# Altium footprint library CONN_HDR_1.27MM_ST.PcbLib: 116 footprints (part 3 of 9)
Each footprint in its own frame and in the unit in brackets; x right, y up, seen from the top. Pads: shape width x height; smd on the part's side, far side on the other; paste and mask are expansions set on the pad; w line width, h text height; cw(c..) or ccw(c..) is an arc to the next point about the centre after c.
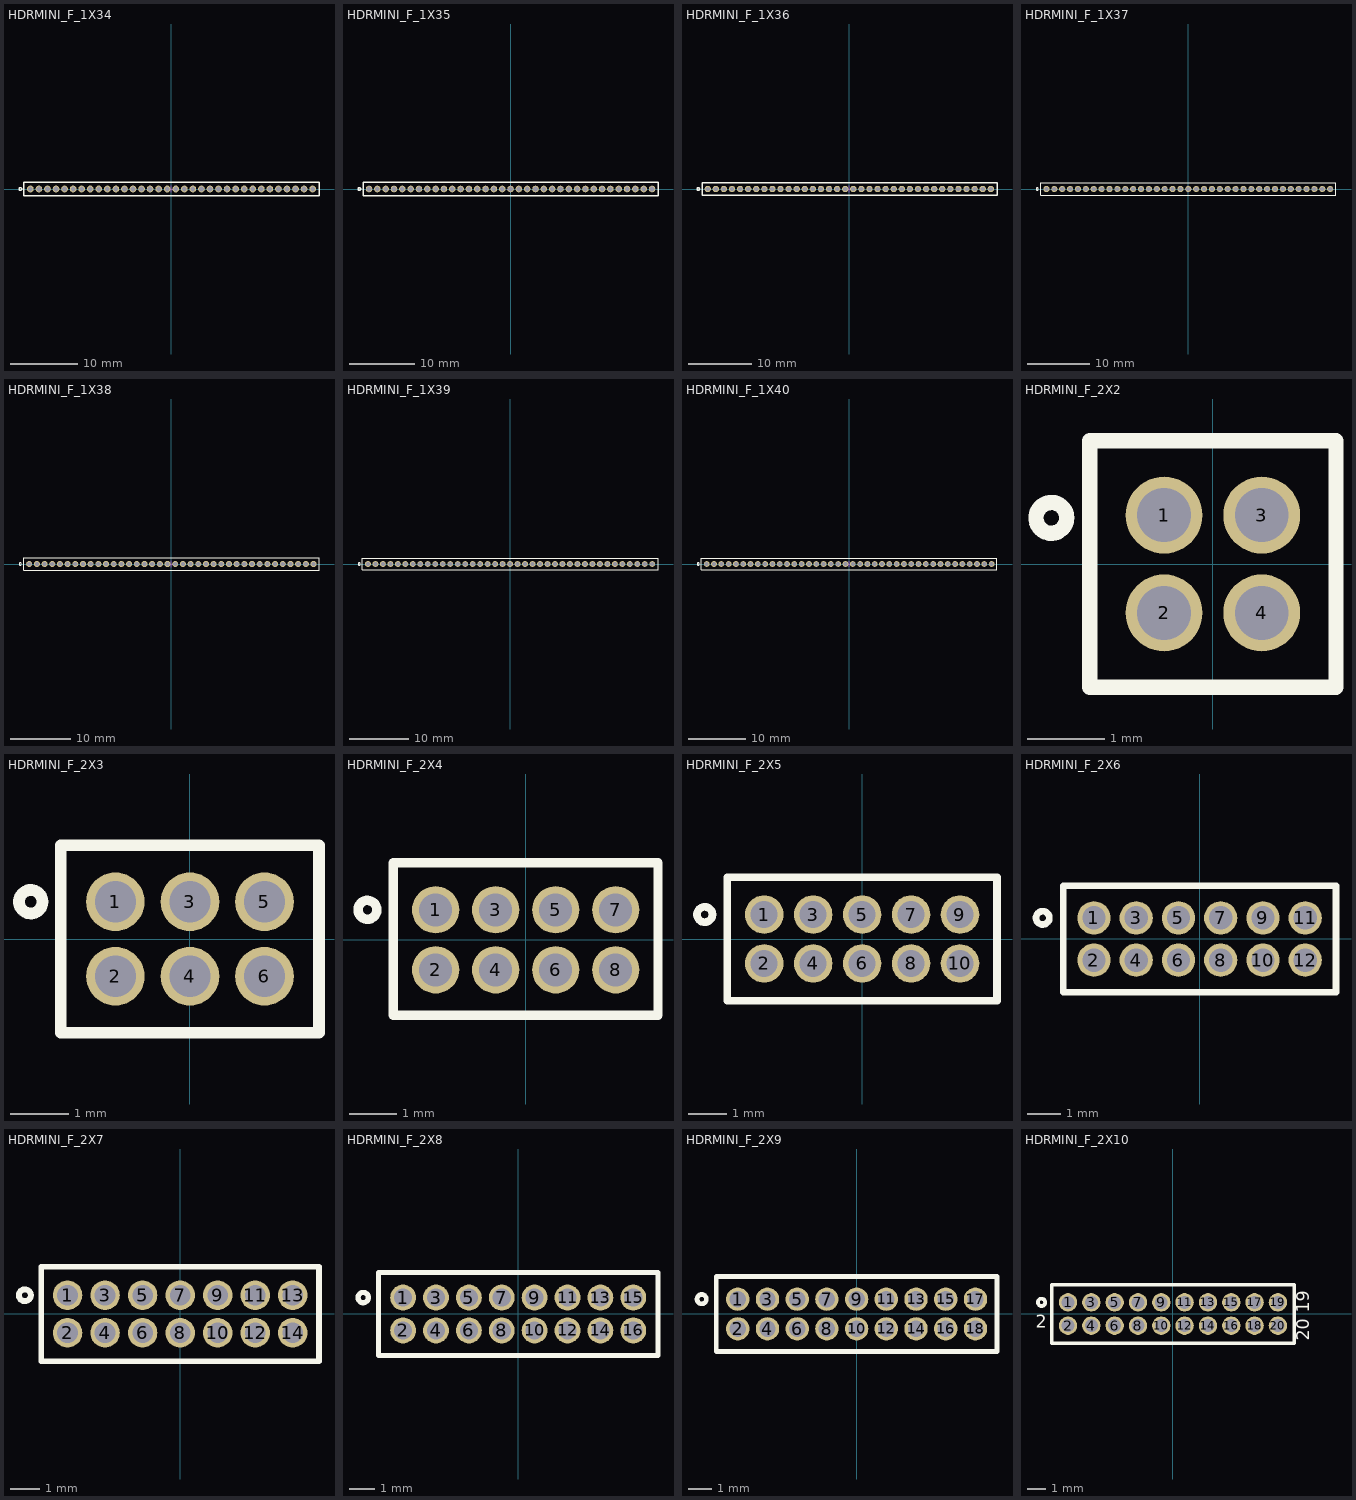
[diagram p2: the footprints below, top view; thin cyan lines are the x and y axes]

## HDRMINI_F_1X34 [mm] "mini header (50mil pitch)"
pads (34):
  round 1 / inner round 1 / far side oval 1x1.4 hole 0.7 mask+0.05: 1(-20.955,0) 2(-19.685,0) 3(-18.415,0) 4(-17.145,0) 5(-15.875,0) 6(-14.605,0) 7(-13.335,0) 8(-12.065,0) 9(-10.795,0) 10(-9.525,0) 11(-8.255,0) 12(-6.985,0) 13(-5.715,0) 14(-4.445,0) 15(-3.175,0) 16(-1.905,0) 17(-0.635,0) 18(0.635,0) 19(1.905,0) 20(3.175,0) 21(4.445,0) 22(5.715,0) 23(6.985,0) 24(8.255,0) 25(9.525,0) 26(10.795,0) 27(12.065,0) 28(13.335,0) 29(14.605,0) 30(15.875,0) 31(17.145,0) 32(18.415,0) 33(19.685,0) 34(20.955,0)
Top Overlay:
  circle w0.2: c-22.44,0 r0.2
  lines w0.2: -21.9,-1 21.9,-1 21.9,1 -21.9,1 -21.9,-1
Mechanical 1:
  lines w0.1: -0.5,0 0.5,0 ; 0,-0.5 0,0.5
3D body "female_header_a-bl127-eg-g34d.stp": height 3.45, standoff -2.35, extent -21.79,-0.9 21.79,0.9

## HDRMINI_F_1X35 [mm] "mini header (50mil pitch)"
pads (35):
  round 1 / inner round 1 / far side oval 1x1.4 hole 0.7 mask+0.05: 1(-21.59,0) 2(-20.32,0) 3(-19.05,0) 4(-17.78,0) 5(-16.51,0) 6(-15.24,0) 7(-13.97,0) 8(-12.7,0) 9(-11.43,0) 10(-10.16,0) 11(-8.89,0) 12(-7.62,0) 13(-6.35,0) 14(-5.08,0) 15(-3.81,0) 16(-2.54,0) 17(-1.27,0) 18(0,0) 19(1.27,0) 20(2.54,0) 21(3.81,0) 22(5.08,0) 23(6.35,0) 24(7.62,0) 25(8.89,0) 26(10.16,0) 27(11.43,0) 28(12.7,0) 29(13.97,0) 30(15.24,0) 31(16.51,0) 32(17.78,0) 33(19.05,0) 34(20.32,0) 35(21.59,0)
Top Overlay:
  circle w0.2: c-23.075,0 r0.2
  lines w0.2: -22.5,-1 22.5,-1 22.5,1 -22.5,1 -22.5,-1
Mechanical 1:
  lines w0.1: -0.5,0 0.5,0 ; 0,-0.5 0,0.5
3D body "female_header_a-bl127-eg-g35d.stp": height 3.45, standoff -2.35, extent -22.425,-0.9 22.425,0.9

## HDRMINI_F_1X36 [mm] "mini header (50mil pitch)"
pads (36):
  round 1 / inner round 1 / far side oval 1x1.4 hole 0.7 mask+0.05: 1(-22.225,0) 2(-20.955,0) 3(-19.685,0) 4(-18.415,0) 5(-17.145,0) 6(-15.875,0) 7(-14.605,0) 8(-13.335,0) 9(-12.065,0) 10(-10.795,0) 11(-9.525,0) 12(-8.255,0) 13(-6.985,0) 14(-5.715,0) 15(-4.445,0) 16(-3.175,0) 17(-1.905,0) 18(-0.635,0) 19(0.635,0) 20(1.905,0) 21(3.175,0) 22(4.445,0) 23(5.715,0) 24(6.985,0) 25(8.255,0) 26(9.525,0) 27(10.795,0) 28(12.065,0) 29(13.335,0) 30(14.605,0) 31(15.875,0) 32(17.145,0) 33(18.415,0) 34(19.685,0) 35(20.955,0) 36(22.225,0)
Top Overlay:
  circle w0.2: c-23.71,0 r0.2
  lines w0.2: -23.1,-1 23.2,-1 23.2,1 -23.1,1 -23.1,-1
Mechanical 1:
  lines w0.1: -0.5,0 0.5,0 ; 0,-0.5 0,0.5
3D body "female_header_a-bl127-eg-g36d.stp": height 3.45, standoff -2.35, extent -23.06,-0.9 23.06,0.9

## HDRMINI_F_1X37 [mm] "mini header (50mil pitch)"
pads (37):
  round 1 / inner round 1 / far side oval 1x1.4 hole 0.7 mask+0.05: 1(-22.86,0) 2(-21.59,0) 3(-20.32,0) 4(-19.05,0) 5(-17.78,0) 6(-16.51,0) 7(-15.24,0) 8(-13.97,0) 9(-12.7,0) 10(-11.43,0) 11(-10.16,0) 12(-8.89,0) 13(-7.62,0) 14(-6.35,0) 15(-5.08,0) 16(-3.81,0) 17(-2.54,0) 18(-1.27,0) 19(0,0) 20(1.27,0) 21(2.54,0) 22(3.81,0) 23(5.08,0) 24(6.35,0) 25(7.62,0) 26(8.89,0) 27(10.16,0) 28(11.43,0) 29(12.7,0) 30(13.97,0) 31(15.24,0) 32(16.51,0) 33(17.78,0) 34(19.05,0) 35(20.32,0) 36(21.59,0) 37(22.86,0)
Top Overlay:
  circle w0.2: c-24.345,0 r0.2
  lines w0.2: -23.8,-1 23.8,-1 23.8,1 -23.8,1 -23.8,-1
Mechanical 1:
  lines w0.1: -0.5,0 0.5,0 ; 0,-0.5 0,0.5
3D body "female_header_a-bl127-eg-g37d.stp": height 3.45, standoff -2.35, extent -23.695,-0.9 23.695,0.9

## HDRMINI_F_1X38 [mm] "mini header (50mil pitch)"
pads (38):
  round 1 / inner round 1 / far side oval 1x1.4 hole 0.7 mask+0.05: 1(-23.495,0) 2(-22.225,0) 3(-20.955,0) 4(-19.685,0) 5(-18.415,0) 6(-17.145,0) 7(-15.875,0) 8(-14.605,0) 9(-13.335,0) 10(-12.065,0) 11(-10.795,0) 12(-9.525,0) 13(-8.255,0) 14(-6.985,0) 15(-5.715,0) 16(-4.445,0) 17(-3.175,0) 18(-1.905,0) 19(-0.635,0) 20(0.635,0) 21(1.905,0) 22(3.175,0) 23(4.445,0) 24(5.715,0) 25(6.985,0) 26(8.255,0) 27(9.525,0) 28(10.795,0) 29(12.065,0) 30(13.335,0) 31(14.605,0) 32(15.875,0) 33(17.145,0) 34(18.415,0) 35(19.685,0) 36(20.955,0) 37(22.225,0) 38(23.495,0)
Top Overlay:
  circle w0.2: c-24.98,0 r0.2
  lines w0.2: -24.4,-1 -24.4,1 24.4,1 24.4,-1 -24.4,-1
Mechanical 1:
  lines w0.1: -0.5,0 0.5,0 ; 0,-0.5 0,0.5
3D body "female_header_a-bl127-eg-g38d.stp": height 3.45, standoff -2.35, extent -24.33,-0.9 24.33,0.9

## HDRMINI_F_1X39 [mm] "mini header (50mil pitch)"
pads (39):
  round 1 / inner round 1 / far side oval 1x1.4 hole 0.7 mask+0.05: 1(-24.13,0) 2(-22.86,0) 3(-21.59,0) 4(-20.32,0) 5(-19.05,0) 6(-17.78,0) 7(-16.51,0) 8(-15.24,0) 9(-13.97,0) 10(-12.7,0) 11(-11.43,0) 12(-10.16,0) 13(-8.89,0) 14(-7.62,0) 15(-6.35,0) 16(-5.08,0) 17(-3.81,0) 18(-2.54,0) 19(-1.27,0) 20(0,0) 21(1.27,0) 22(2.54,0) 23(3.81,0) 24(5.08,0) 25(6.35,0) 26(7.62,0) 27(8.89,0) 28(10.16,0) 29(11.43,0) 30(12.7,0) 31(13.97,0) 32(15.24,0) 33(16.51,0) 34(17.78,0) 35(19.05,0) 36(20.32,0) 37(21.59,0) 38(22.86,0) 39(24.13,0)
Top Overlay:
  circle w0.2: c-25.615,0 r0.2
  lines w0.2: -25.1,-1 -25.1,1 25.1,1 25.1,-1 -25.1,-1
Mechanical 1:
  lines w0.1: -0.5,0 0.5,0 ; 0,-0.5 0,0.5
3D body "female_header_a-bl127-eg-g39d.stp": height 3.45, standoff -2.35, extent -24.965,-0.9 24.965,0.9

## HDRMINI_F_1X40 [mm] "mini header (50mil pitch)"
pads (40):
  round 1 / inner round 1 / far side oval 1x1.4 hole 0.7 mask+0.05: 1(-24.765,0) 2(-23.495,0) 3(-22.225,0) 4(-20.955,0) 5(-19.685,0) 6(-18.415,0) 7(-17.145,0) 8(-15.875,0) 9(-14.605,0) 10(-13.335,0) 11(-12.065,0) 12(-10.795,0) 13(-9.525,0) 14(-8.255,0) 15(-6.985,0) 16(-5.715,0) 17(-4.445,0) 18(-3.175,0) 19(-1.905,0) 20(-0.635,0) 21(0.635,0) 22(1.905,0) 23(3.175,0) 24(4.445,0) 25(5.715,0) 26(6.985,0) 27(8.255,0) 28(9.525,0) 29(10.795,0) 30(12.065,0) 31(13.335,0) 32(14.605,0) 33(15.875,0) 34(17.145,0) 35(18.415,0) 36(19.685,0) 37(20.955,0) 38(22.225,0) 39(23.495,0) 40(24.765,0)
Top Overlay:
  circle w0.2: c-26.25,0 r0.2
  lines w0.2: -25.7,-1 25.7,-1 25.7,1 -25.7,1 -25.7,-1
Mechanical 1:
  lines w0.1: -0.5,0 0.5,0 ; 0,-0.5 0,0.5
3D body "female_header_a-bl127-eg-g40d.stp": height 3.45, standoff -2.35, extent -25.6,-0.9 25.6,0.9

## HDRMINI_F_2X2 [mm] "mini header (50mil pitch)"
pads (4):
  round 1 hole 0.7 mask+0.05: 1(-0.635,0.635) 2(-0.635,-0.635) 3(0.635,0.635) 4(0.635,-0.635)
Top Overlay:
  circle w0.2: c-2.1,0.6 r0.2
  lines w0.2: -1.6,-1.6 -1.6,1.6 1.6,1.6 1.6,-1.6 -1.6,-1.6
3D body "female_header_a-bl127-eg-g02d.step": height 3.45, standoff -2.35, extent -1.47,-0.265 1.275,1.535
3D body "female_header_a-bl127-eg-g02d.step": height 3.45, standoff -2.35, extent -1.47,-1.535 1.275,0.265

## HDRMINI_F_2X3 [mm] "mini header (50mil pitch)"
pads (6):
  round 1 hole 0.7 mask+0.05: 1(-1.27,0.635) 2(-1.27,-0.635) 3(0,0.635) 4(0,-0.635) 5(1.27,0.635) 6(1.27,-0.635)
Top Overlay:
  circle w0.2: c-2.713,0.635 r0.2
  lines w0.2: -2.2,-1.6 -2.2,1.6 2.2,1.6 2.2,-1.6 -2.2,-1.6
3D body "female_header_a-bl127-eg-g03d.stp": height 3.45, standoff -2.35, extent -2.105,-1.535 2.105,0.265
3D body "female_header_a-bl127-eg-g03d.stp": height 3.45, standoff -2.35, extent -2.105,-0.265 2.105,1.535

## HDRMINI_F_2X4 [mm] "mini header (50mil pitch)"
pads (8):
  round 1 hole 0.7 mask+0.05: 1(-1.905,0.635) 2(-1.905,-0.635) 3(-0.635,0.635) 4(-0.635,-0.635) 5(0.635,0.635) 6(0.635,-0.635) 7(1.905,0.635) 8(1.905,-0.635)
Top Overlay:
  circle w0.2: c-3.348,0.635 r0.2
  lines w0.2: -2.8,-1.6 -2.8,1.635 2.8,1.635 2.8,-1.6 -2.8,-1.6
3D body "female_header_a-bl127-eg-g04d.stp": height 3.45, standoff -2.35, extent -2.74,-0.265 2.74,1.535
3D body "female_header_a-bl127-eg-g04d.stp": height 3.45, standoff -2.35, extent -2.74,-1.535 2.74,0.265

## HDRMINI_F_2X5 [mm] "mini header (50mil pitch)"
pads (10):
  round 1 hole 0.7 mask+0.05: 1(-2.54,0.635) 2(-2.54,-0.635) 3(-1.27,0.635) 4(-1.27,-0.635) 5(0,0.635) 6(0,-0.635) 7(1.27,0.635) 8(1.27,-0.635) 9(2.54,0.635) 10(2.54,-0.635)
Top Overlay:
  circle w0.2: c-4.083,0.635 r0.2
  lines w0.2: -3.5,-1.6 3.5,-1.6 3.5,1.6 -3.5,1.6 -3.5,-1.6
3D body "female_header_a-bl127-eg-g05d.stp": height 3.45, standoff -2.35, extent -3.375,-0.265 3.375,1.535
3D body "female_header_a-bl127-eg-g05d.stp": height 3.45, standoff -2.35, extent -3.375,-1.535 3.375,0.265

## HDRMINI_F_2X6 [mm] "mini header (50mil pitch)"
pads (12):
  round 1 hole 0.7 mask+0.05: 1(-3.175,0.635) 2(-3.175,-0.635) 3(-1.905,0.635) 4(-1.905,-0.635) 5(-0.635,0.635) 6(-0.635,-0.635) 7(0.635,0.635) 8(0.635,-0.635) 9(1.905,0.635) 10(1.905,-0.635) 11(3.175,0.635) 12(3.175,-0.635)
Top Overlay:
  circle w0.2: c-4.718,0.635 r0.2
  lines w0.2: -4.1,-1.6 -4.1,1.6 4.1,1.6 4.1,-1.6 -4.1,-1.6
3D body "female_header_a-bl127-eg-g06d.stp": height 3.45, standoff -2.35, extent -4.01,-0.265 4.01,1.535
3D body "female_header_a-bl127-eg-g06d.stp": height 3.45, standoff -2.35, extent -4.01,-1.535 4.01,0.265

## HDRMINI_F_2X7 [mm] "mini header (50mil pitch)"
pads (14):
  round 1 hole 0.7 mask+0.05: 1(-3.81,0.635) 2(-3.81,-0.635) 3(-2.54,0.635) 4(-2.54,-0.635) 5(-1.27,0.635) 6(-1.27,-0.635) 7(0,0.635) 8(0,-0.635) 9(1.27,0.635) 10(1.27,-0.635) 11(2.54,0.635) 12(2.54,-0.635) 13(3.81,0.635) 14(3.81,-0.635)
Top Overlay:
  circle w0.2: c-5.253,0.635 r0.2
  lines w0.2: -4.7,-1.6 -4.7,1.6 4.7,1.6 4.7,-1.6 -4.7,-1.6
3D body "female_header_a-bl127-eg-g07d.stp": height 3.45, standoff -2.35, extent -4.645,-0.265 4.645,1.535
3D body "female_header_a-bl127-eg-g07d.stp": height 3.45, standoff -2.35, extent -4.645,-1.535 4.645,0.265

## HDRMINI_F_2X8 [mm] "mini header (50mil pitch)"
pads (16):
  round 1 hole 0.7 mask+0.05: 1(-4.445,0.635) 2(-4.445,-0.635) 3(-3.175,0.635) 4(-3.175,-0.635) 5(-1.905,0.635) 6(-1.905,-0.635) 7(-0.635,0.635) 8(-0.635,-0.635) 9(0.635,0.635) 10(0.635,-0.635) 11(1.905,0.635) 12(1.905,-0.635) 13(3.175,0.635) 14(3.175,-0.635) 15(4.445,0.635) 16(4.445,-0.635)
Top Overlay:
  circle w0.2: c-5.988,0.635 r0.2
  lines w0.2: -5.4,-1.6 -5.4,1.6 5.4,1.6 5.4,-1.6 -5.4,-1.6
3D body "female_header_a-bl127-eg-g08d.stp": height 3.45, standoff -2.35, extent -5.28,-1.535 5.28,0.265
3D body "female_header_a-bl127-eg-g08d.stp": height 3.45, standoff -2.35, extent -5.28,-0.265 5.28,1.535

## HDRMINI_F_2X9 [mm] "mini header (50mil pitch)"
pads (18):
  round 1 hole 0.7 mask+0.05: 1(-5.08,0.635) 2(-5.08,-0.635) 3(-3.81,0.635) 4(-3.81,-0.635) 5(-2.54,0.635) 6(-2.54,-0.635) 7(-1.27,0.635) 8(-1.27,-0.635) 9(0,0.635) 10(0,-0.635) 11(1.27,0.635) 12(1.27,-0.635) 13(2.54,0.635) 14(2.54,-0.635) 15(3.81,0.635) 16(3.81,-0.635) 17(5.08,0.635) 18(5.08,-0.635)
Top Overlay:
  circle w0.2: c-6.623,0.635 r0.2
  lines w0.2: -6,-1.6 6,-1.6 6,1.6 -6,1.6 -6,-1.6
3D body "female_header_a-bl127-eg-g09d.stp": height 3.45, standoff -2.35, extent -5.915,-1.535 5.915,0.265
3D body "female_header_a-bl127-eg-g09d.stp": height 3.45, standoff -2.35, extent -5.915,-0.265 5.915,1.535

## HDRMINI_F_2X10 [mm] "mini header (50mil pitch)"
pads (20):
  round 1 hole 0.7 mask+0.05: 1(-5.715,0.635) 2(-5.715,-0.635) 3(-4.445,0.635) 4(-4.445,-0.635) 5(-3.175,0.635) 6(-3.175,-0.635) 7(-1.905,0.635) 8(-1.905,-0.635) 9(-0.635,0.635) 10(-0.635,-0.635) 11(0.635,0.635) 12(0.635,-0.635) 13(1.905,0.635) 14(1.905,-0.635) 15(3.175,0.635) 16(3.175,-0.635) 17(4.445,0.635) 18(4.445,-0.635) 19(5.715,0.635) 20(5.715,-0.635)
Top Overlay:
  circle w0.2: c-7.158,0.635 r0.2
  lines w0.2: -6.6,-1.6 6.6,-1.6 6.6,1.6 -6.6,1.6 -6.6,-1.6
  text "20" at 7.679,-1.457 h1.2
  text "19" at 7.679,0.07 h1.2
  text "2" at -7.458,-0.986 h1.2
3D body "female_header_a-bl127-eg-g10d.stp": height 3.45, standoff -2.35, extent -6.55,-1.535 6.55,0.265
3D body "female_header_a-bl127-eg-g10d.stp": height 3.45, standoff -2.35, extent -6.55,-0.265 6.55,1.535